# Altium schematic symbol library hphonglib.SchLib: 1131 symbols (part 2 of 8) (continued)
## AVR.ATmega3250
designator IC?  (value not drawn)
Manufacturer: Atmel; Flash: Kb; SRAM: Bytes; Volt: V; CPU Speed (MIPS): 0 MIPS; ComponentLink1Description: Degikey Part link; ComponentLink2Description: Open DataSheet; ComponentLink2URL: H:\LIBRARY\LIBRARY.Datasheet\; Publisher: Hoang Nguyen
footprint TQFP100
pins: 1 DNC, 2 PE0(RXD/PCINT0) (io), 3 PE1(TXD/PCINT1) (io), 4 PE2(XCK/AIN0/PCINT2) (io), 5 PE3(AIN1/PCINT3) (io), 6 PE4(USCK/SCL/PCINT4) (io), 7 PE5(DI/SDA/PCINT5) (io), 8 PE6(DO/PCINT6) (io), 9 PE7(CLKO/PCINT7) (io), 10 VCC, 11 GND, 12 DNC, 13 PJ0(PCINT24) (io), 14 PJ1(PCINT25) (io), 15 DNC, 16 DNC, 17 DNC, 18 DNC, 19 (~{SS}/PCINT8)PB0 (io), 20 (SCK/PCINT9)PB1 (io), 21 (MOSI/PCINT10)PB2 (io), 22 (MISO/PCINT11)PB3 (io), 23 (OC0A/PCINT12)PB4 (io), 24 (OC1A/PCINT13)PB5 (io), 25 (OC1B/PCINT14)PB6 (io), 26 (OC2A/PCINT15)PB7 (io), 27 DNC, 28 PG3(T1) (io), 29 PG4(T0) (io), 30 PG5(~{RESET}) (in), 31 VCC, 32 GND, 33 XTAL2(TOSC2), 34 XTAL1(TOSC1), 35 DNC, 36 DNC, 37 PJ2(PCINT26) (io), 38 PJ3(PCINT27) (io), 39 PJ4(PCINT28) (io), 40 PJ5(PCINT29) (io), 41 PJ6(PCINT30) (io), 42 DNC, 43 (ICP1)PD0 (io), 44 (INT0)PD1 (io), 45 PD2 (io), 46 PD3 (io), 47 PD4 (io), 48 PD5 (io), 49 PD6 (io), 50 PD7 (io), 51 PG0 (io), 52 PG1 (io), 53 PC0 (io), 54 PC1 (io), 55 PC2 (io), 56 PC3 (io), 57 PC4 (io), 58 PC5 (io), 59 DNC, 60 DNC, 61 DNC, 62 DNC, 63 (PCINT16)PH0 (io), 64 (PCINT17)PH1 (io), 65 (PCINT18)PH2 (io), 66 (PCINT19)PH3 (io), 67 DNC, 68 PC6 (io), 69 PC7 (io), 70 PG2 (io), 71 PA7 (io), 72 PA6 (io), 73 PA5 (io), 74 PA4 (io), 75 PA3 (io), 76 PA2 (io), 77 PA1 (io), 78 PA0 (io), 79 DNC, 80 VCC, 81 GND, 82 DNC, 83 DNC, 84 (PCINT20)PH4 (io), 85 (PCINT21)PH5 (io), 86 (PCINT22)PH6 (io), 87 (PCINT23)PH7 (io), 88 DNC, 89 DNC, 90 (TDI/ADC7)PF7 (io), 91 (TDO/ADC6)PF6 (io), 92 (TMS/ADC5)PF5 (io), 93 (TCK/ADC4)PF4 (io), 94 (ADC3)PF3 (io), 95 (ADC2)PF2 (io), 96 (ADC1)PF1 (io), 97 (ADC0)PF0 (io), 98 AREF, 99 AGND, 100 AVCC

## AVR.ATmega3290
designator IC?
Manufacturer: Atmel; Flash: Kb; SRAM: Bytes; Volt: V; CPU Speed (MIPS): 0 MIPS; ComponentLink1Description: Degikey Part link; ComponentLink2Description: Open DataSheet; ComponentLink2URL: H:\LIBRARY\LIBRARY.Datasheet\; Publisher: Hoang Nguyen
footprint TQFP100
pins: 1 DNC, 2 PE0(RXD/PCINT0) (io), 3 PE1(TXD/PCINT1) (io), 4 PE2(XCK/AIN0/PCINT2) (io), 5 PE3(AIN1/PCINT3) (io), 6 PE4(USCK/SCL/PCINT4) (io), 7 PE5(DI/SDA/PCINT5) (io), 8 PE6(DO/PCINT6) (io), 9 PE7(CLKO/PCINT7) (io), 10 VCC, 11 GND, 12 DNC, 13 PJ0(PCINT24) (io), 14 PJ1(PCINT25) (io), 15 DNC, 16 DNC, 17 DNC, 18 DNC, 19 (~{SS}/PCINT8)PB0 (io), 20 (SCK/PCINT9)PB1 (io), 21 (MOSI/PCINT10)PB2 (io), 22 (MISO/PCINT11)PB3 (io), 23 (OC0A/PCINT12)PB4 (io), 24 (OC1A/PCINT13)PB5 (io), 25 (OC1B/PCINT14)PB6 (io), 26 (OC2A/PCINT15)PB7 (io), 27 DNC, 28 PG3(Seg23/T1) (io), 29 PG4(Seg24/T0) (io), 30 PG5(~{RESET}) (in), 31 VCC, 32 GND, 33 XTAL2(TOSC2), 34 XTAL1(TOSC1), 35 DNC, 36 DNC, 37 PJ2(PCINT26) (io), 38 PJ3(PCINT27) (io), 39 PJ4(PCINT28) (io), 40 PJ5(PCINT29) (io), 41 PJ6(PCINT30) (io), 42 DNC, 43 PD0(Seg22/ICP1) (io), 44 PD1(Seg21/INT0) (io), 45 PD2(Seg20) (io), 46 PD3(Seg19) (io), 47 PD4(Seg18) (io), 48 PD5(Seg17) (io), 49 PD6(Seg16) (io), 50 PD7(Seg15) (io), 51 PG0(Seg14) (io), 52 PG1(Seg13) (io), 53 PC0(Seg12) (io), 54 PC1(Seg11) (io), 55 PC2(Seg10) (io), 56 PC3(Seg9) (io), 57 PC4(Seg8) (io), 58 PC5(Seg7) (io), 59 DNC, 60 DNC, 61 DNC, 62 DNC, 63 (PCINT16)PH0 (io), 64 (PCINT17)PH1 (io), 65 (PCINT18)PH2 (io), 66 (PCINT19)PH3 (io), 67 DNC, 68 PC6(Seg6) (io), 69 PC7(Seg5) (io), 70 PG2(Seg4) (io), 71 PA7(Seg3) (io), 72 PA6(Seg2) (io), 73 PA5(Seg1) (io), 74 PA4(Seg0) (io), 75 PA3(COM3) (io), 76 PA2(COM2) (io), 77 PA1(COM1) (io), 78 PA0(COM0) (io), 79 DNC, 80 VCC, 81 GND, 82 DNC, 83 DNC, 84 (PCINT20)PH4 (io), 85 (PCINT21)PH5 (io), 86 (PCINT22)PH6 (io), 87 (PCINT23)PH7 (io), 88 DNC, 89 DNC, 90 (TDI/ADC7)PF7 (io), 91 (TDO/ADC6)PF6 (io), 92 (TMS/ADC5)PF5 (io), 93 (TCK/ADC4)PF4 (io), 94 (ADC3)PF3 (io), 95 (ADC2)PF2 (io), 96 (ADC1)PF1 (io), 97 (ADC0)PF0 (io), 98 AREF, 99 AGND, 100 AVCC

## AVR.ATMEGA8535
designator U?  (value not drawn)
Atmel AVR MCU; Flash: Kb; SRAM: Bytes; Volt: V; CPU Speed (MIPS): 0 MIPS; ComponentLink1Description: Degikey Part link; ComponentLink2Description: Open DataSheet; ComponentLink2URL: H:\LIBRARY\LIBRARY.Datasheet\; Manufacturer: Atmel; Publisher: Hoang Nguyen
footprint IC40N
pins: 1 PB0/XCT/T0, 2 PB1/T1, 3 PB2/INT2/AIN0, 4 PB3/OC0/AIN1, 5 PB4/[SS], 6 PB5/MOSI, 7 PB6/MISO, 8 PB7/SCK, 9 [RESET], 10 VCC, 11 GND, 12 XTAL2, 13 XTAL1, 14 PD0/RXD, 15 PD1/TXD, 16 PB2/INT0, 17 PD3/INT1, 18 PD4/OC1B, 19 PD5/OC1A, 20 PD6/ICP1, 21 PD7/OC2, 22 PC0/SCL, 23 PC1/SDA, 24 PC2, 25 PC3, 26 PC4, 27 PC5, 28 PC6/TOSC1, 29 PC7/TOSC2, 30 AVCC, 31 GND, 32 AREF, 33 PA7/ADC7, 34 PA6/ADC6, 35 PA5/ADC5, 36 PA4/ADC4, 37 PA3/ADC3, 38 PA2/ADC2, 39 PA1/ADC1, 40 PA0/ADC0

## AVR.ATMEGA8535-DIL40
designator IC?
Manufacturer: Atmel; Flash: Kb; SRAM: Bytes; Volt: V; CPU Speed (MIPS): 0 MIPS; ComponentLink1Description: Degikey Part link; ComponentLink2Description: Open DataSheet; ComponentLink2URL: H:\LIBRARY\LIBRARY.Datasheet\; Publisher: Hoang Nguyen
pins: 1 PB0(XCK/T0) (io), 2 PB1(T1) (io), 3 PB2(INT2/AIN0) (io), 4 PB3(OC0/AIN1) (io), 5 PB4(~{SS}) (io), 6 PB5(MOSI) (io), 7 PB6[MISO) (io), 8 PB7[SCK) (io), 9 ~{RESET} (in), 10 VCC, 11 GND, 12 XTAL2, 13 XTAL1, 14 PD0(RXD) (io), 15 PD1(TXD) (io), 16 PD2(INT0) (io), 17 PD3(INT1) (io), 18 PD4(OC1B) (io), 19 PD5(OC1A) (io), 20 PD6(ICP) (io), 21 PD7(OC2) (io), 22 PC0(SCL) (io), 23 PC1(SDA) (io), 24 PC2 (io), 25 PC3 (io), 26 PC4 (io), 27 PC5 (io), 28 PC6(TOSC1) (io), 29 PC7(TOSC2) (io), 30 AVCC, 31 AGND, 32 AREF, 33 PA7(ADC7) (io), 34 PA6(ADC6) (io), 35 PA5(ADC5) (io), 36 PA4(ADC4) (io), 37 PA3(ADC3) (io), 38 PA2(ADC2) (io), 39 PA1(ADC1) (io), 40 PA0(ADC0) (io)

## AVR.ATMEGA8535-PLCC44
designator IC?
Manufacturer: Atmel; Flash: Kb; SRAM: Bytes; Volt: V; CPU Speed (MIPS): 0 MIPS; ComponentLink1Description: Degikey Part link; ComponentLink2Description: Open DataSheet; ComponentLink2URL: H:\LIBRARY\LIBRARY.Datasheet\; Publisher: Hoang Nguyen
pins: 1 GND, 2 PB0(XCK/T0) (io), 3 PB1(T1) (io), 4 PB2(INT2/AIN0) (io), 5 PB3(OC0/AIN1) (io), 6 PB4(~{SS}) (io), 7 PB5(MOSI) (io), 8 PB6[MISO) (io), 9 PB7[SCK) (io), 10 ~{RESET} (in), 11 VCC, 12 GND, 13 XTAL2, 14 XTAL1, 15 PD0(RXD) (io), 16 PD1(TXD) (io), 17 PD2(INT0) (io), 18 PD3(INT1) (io), 19 PD4(OC1B) (io), 20 PD5(OC1A) (io), 21 PD6(ICP) (io), 22 PD7(OC2) (io), 23 VCC, 24 GND, 25 PC0(SCL) (io), 26 PC1(SDA) (io), 27 PC2 (io), 28 PC3 (io), 29 PC4 (io), 30 PC5 (io), 31 PC6 (io), 32 PC7 (io), 33 AVCC, 34 AGND, 35 AREF, 36 PA7(ADC7) (io), 37 PA6(ADC6) (io), 38 PA5(ADC5) (io), 39 PA4(ADC4) (io), 40 PA3(ADC3) (io), 41 PA2(ADC2) (io), 42 PA1(ADC1) (io), 43 PA0(ADC0) (io), 44 VCC

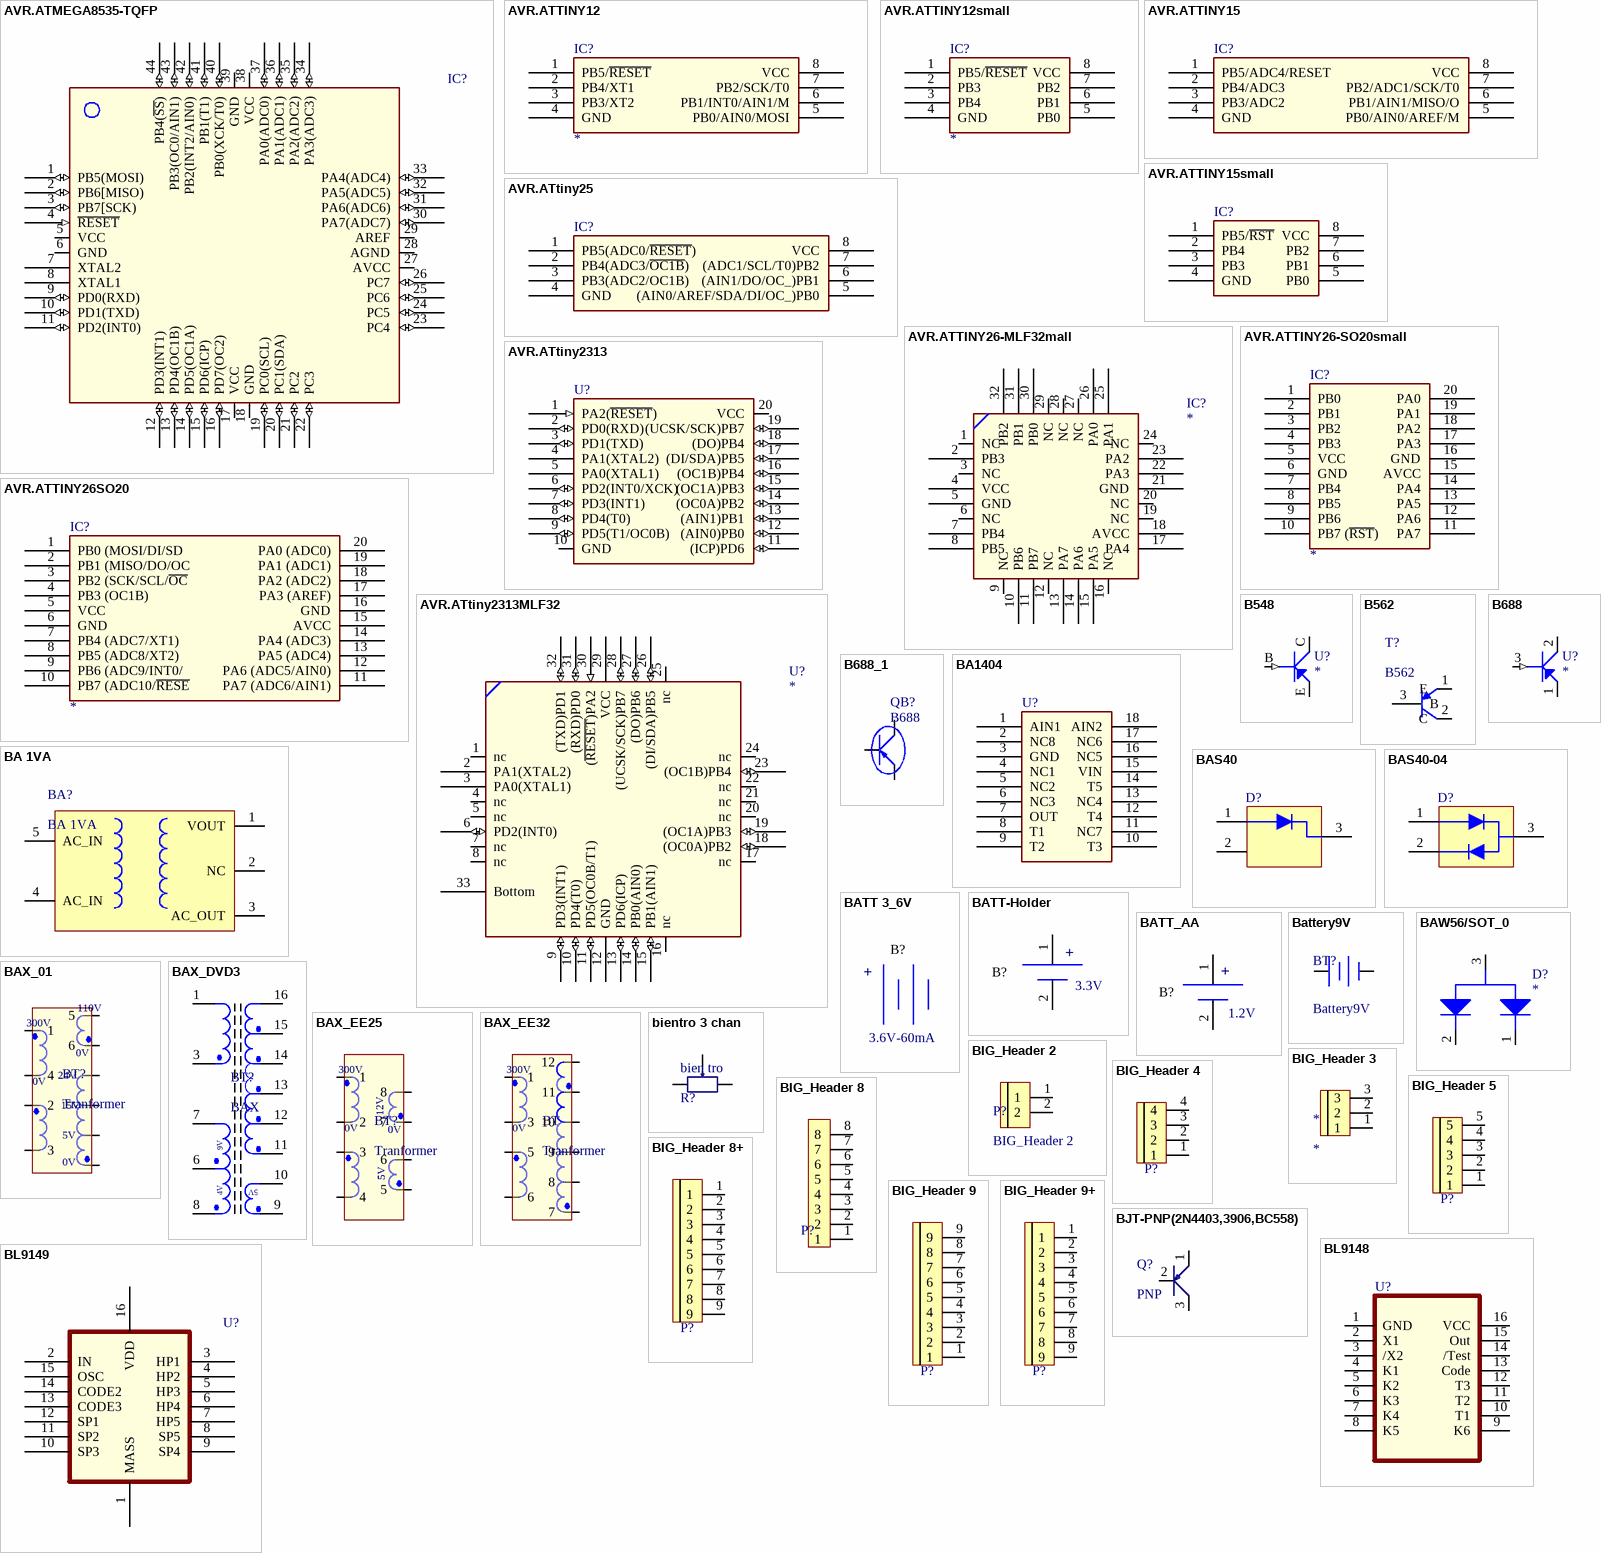
[diagram p10: symbols AVR.ATMEGA8535-TQFP to BL9149]

## AVR.ATMEGA8535-TQFP
designator IC?  (value not drawn)
Manufacturer: Atmel; Flash: Kb; SRAM: Bytes; Volt: V; CPU Speed (MIPS): 0 MIPS; ComponentLink1Description: Degikey Part link; ComponentLink2Description: Open DataSheet; ComponentLink2URL: H:\LIBRARY\LIBRARY.Datasheet\; Publisher: Hoang Nguyen
pins: 1 PB5(MOSI) (io), 2 PB6[MISO) (io), 3 PB7[SCK) (io), 4 ~{RESET} (in), 5 VCC, 6 GND, 7 XTAL2, 8 XTAL1, 9 PD0(RXD) (io), 10 PD1(TXD) (io), 11 PD2(INT0) (io), 12 PD3(INT1) (io), 13 PD4(OC1B) (io), 14 PD5(OC1A) (io), 15 PD6(ICP) (io), 16 PD7(OC2) (io), 17 VCC, 18 GND, 19 PC0(SCL) (io), 20 PC1(SDA) (io), 21 PC2 (io), 22 PC3 (io), 23 PC4 (io), 24 PC5 (io), 25 PC6 (io), 26 PC7 (io), 27 AVCC, 28 AGND, 29 AREF, 30 PA7(ADC7) (io), 31 PA6(ADC6) (io), 32 PA5(ADC5) (io), 33 PA4(ADC4) (io), 34 PA3(ADC3) (io), 35 PA2(ADC2) (io), 36 PA1(ADC1) (io), 37 PA0(ADC0) (io), 38 VCC, 39 GND, 40 PB0(XCK/T0) (io), 41 PB1(T1) (io), 42 PB2(INT2/AIN0) (io), 43 PB3(OC0/AIN1) (io), 44 PB4(~{SS}) (io)

## AVR.ATTINY12
designator IC?
Manufacturer: Atmel; Flash: Kb; SRAM: Bytes; Volt: V; CPU Speed (MIPS): 0 MIPS; ComponentLink1Description: Degikey Part link; ComponentLink2Description: Open DataSheet; ComponentLink2URL: H:\LIBRARY\LIBRARY.Datasheet\; Publisher: Hoang Nguyen
pins: 1 PB5/~{RESET}, 2 PB4/XT1, 3 PB3/XT2, 4 GND, 5 PB0/AIN0/MOSI, 6 PB1/INT0/AIN1/M, 7 PB2/SCK/T0, 8 VCC

## AVR.ATTINY12small
designator IC?
Manufacturer: Atmel; Flash: Kb; SRAM: Bytes; Volt: V; CPU Speed (MIPS): 0 MIPS; ComponentLink1Description: Degikey Part link; ComponentLink2Description: Open DataSheet; ComponentLink2URL: H:\LIBRARY\LIBRARY.Datasheet\; Publisher: Hoang Nguyen
pins: 1 PB5/~{RESET}, 2 PB3, 3 PB4, 4 GND, 5 PB0, 6 PB1, 7 PB2, 8 VCC

## AVR.ATTINY15
designator IC?  (value not drawn)
Manufacturer: Atmel; Flash: Kb; SRAM: Bytes; Volt: V; CPU Speed (MIPS): 0 MIPS; ComponentLink1Description: Degikey Part link; ComponentLink2Description: Open DataSheet; ComponentLink2URL: H:\LIBRARY\LIBRARY.Datasheet\; Publisher: Hoang Nguyen
pins: 1 PB5/ADC4/RESET, 2 PB4/ADC3, 3 PB3/ADC2, 4 GND, 5 PB0/AIN0/AREF/M, 6 PB1/AIN1/MISO/O, 7 PB2/ADC1/SCK/T0, 8 VCC

## AVR.ATTINY15small
designator IC?  (value not drawn)
Manufacturer: Atmel; Flash: Kb; SRAM: Bytes; Volt: V; CPU Speed (MIPS): 0 MIPS; ComponentLink1Description: Degikey Part link; ComponentLink2Description: Open DataSheet; ComponentLink2URL: H:\LIBRARY\LIBRARY.Datasheet\; Publisher: Hoang Nguyen
pins: 1 PB5/~{RST}, 2 PB4, 3 PB3, 4 GND, 5 PB0, 6 PB1, 7 PB2, 8 VCC

## AVR.ATtiny25
designator IC?  (value not drawn)
Manufacturer: Atmel; Flash: Kb; SRAM: Bytes; Volt: V; CPU Speed (MIPS): 0 MIPS; ComponentLink1Description: Degikey Part link; ComponentLink2Description: Open DataSheet; ComponentLink2URL: H:\LIBRARY\LIBRARY.Datasheet\; Publisher: Hoang Nguyen
footprint DIL/SO8
pins: 1 PB5(ADC0/~{RESET}), 2 PB4(ADC3/~{OC1B}), 3 PB3(ADC2/OC1B), 4 GND, 5 (AIN0/AREF/SDA/DI/OC_)PB0, 6 (AIN1/DO/OC_)PB1, 7 (ADC1/SCL/T0)PB2, 8 VCC

## AVR.ATTINY26-MLF32mall
designator IC?
Manufacturer: Atmel; Flash: Kb; SRAM: Bytes; Volt: V; CPU Speed (MIPS): 0 MIPS; ComponentLink1Description: Degikey Part link; ComponentLink2Description: Open DataSheet; ComponentLink2URL: H:\LIBRARY\LIBRARY.Datasheet\; Publisher: Hoang Nguyen
pins: 1 NC, 2 PB3 (hiz), 3 NC, 4 VCC, 5 GND, 6 NC, 7 PB4 (hiz), 8 PB5 (hiz), 9 NC, 10 PB6 (hiz), 11 PB7 (hiz), 12 NC, 13 PA7 (hiz), 14 PA6 (hiz), 15 PA5 (hiz), 16 NC, 17 PA4 (hiz), 18 AVCC, 19 NC, 20 NC, 21 GND, 22 PA3 (hiz), 23 PA2 (hiz), 24 NC, 25 PA1 (hiz), 26 PA0 (hiz), 27 NC, 28 NC, 29 NC, 30 PB0 (hiz), 31 PB1 (hiz), 32 PB2 (hiz)

## AVR.ATTINY26-SO20small
designator IC?
Manufacturer: Atmel; Flash: Kb; SRAM: Bytes; Volt: V; CPU Speed (MIPS): 0 MIPS; ComponentLink1Description: Degikey Part link; ComponentLink2Description: Open DataSheet; ComponentLink2URL: H:\LIBRARY\LIBRARY.Datasheet\; Publisher: Hoang Nguyen
pins: 1 PB0 (hiz), 2 PB1 (hiz), 3 PB2 (hiz), 4 PB3 (hiz), 5 VCC, 6 GND, 7 PB4 (hiz), 8 PB5 (hiz), 9 PB6 (hiz), 10 PB7 (~{RST}) (hiz), 11 PA7 (hiz), 12 PA6 (hiz), 13 PA5 (hiz), 14 PA4 (hiz), 15 AVCC, 16 GND, 17 PA3 (hiz), 18 PA2 (hiz), 19 PA1 (hiz), 20 PA0 (hiz)

## AVR.ATTINY26SO20
designator IC?
Manufacturer: Atmel; Flash: Kb; SRAM: Bytes; Volt: V; CPU Speed (MIPS): 0 MIPS; ComponentLink1Description: Degikey Part link; ComponentLink2Description: Open DataSheet; ComponentLink2URL: H:\LIBRARY\LIBRARY.Datasheet\; Publisher: Hoang Nguyen
pins: 1 PB0 (MOSI/DI/SD (hiz), 2 PB1 (MISO/DO/OC (hiz), 3 PB2 (SCK/SCL/~{OC} (hiz), 4 PB3 (OC1B) (hiz), 5 VCC, 6 GND, 7 PB4 (ADC7/XT1) (hiz), 8 PB5 (ADC8/XT2) (hiz), 9 PB6 (ADC9/INT0/ (hiz), 10 PB7 (ADC10/~{RESE} (hiz), 11 PA7 (ADC6/AIN1) (hiz), 12 PA6 (ADC5/AIN0) (hiz), 13 PA5 (ADC4) (hiz), 14 PA4 (ADC3) (hiz), 15 AVCC, 16 GND, 17 PA3 (AREF) (hiz), 18 PA2 (ADC2) (hiz), 19 PA1 (ADC1) (hiz), 20 PA0 (ADC0) (hiz)

## AVR.ATtiny2313
designator U?  (value not drawn)
Manufacturer: Atmel; Flash: Kb; SRAM: Bytes; Volt: V; CPU Speed (MIPS): 0 MIPS; ComponentLink1Description: Degikey Part link; ComponentLink2Description: Open DataSheet; ComponentLink2URL: H:\LIBRARY\LIBRARY.Datasheet\; Publisher: Hoang Nguyen
pins: 1 PA2(~{RESET}) (in), 2 PD0(RXD) (io), 3 PD1(TXD) (io), 4 PA1(XTAL2), 5 PA0(XTAL1), 6 PD2(INT0/XCK) (io), 7 PD3(INT1) (io), 8 PD4(T0) (io), 9 PD5(T1/OC0B) (io), 10 GND, 11 (ICP)PD6 (io), 12 (AIN0)PB0 (io), 13 (AIN1)PB1 (io), 14 (OC0A)PB2 (io), 15 (OC1A)PB3 (io), 16 (OC1B)PB4 (io), 17 (DI/SDA)PB5 (io), 18 (DO)PB4 (io), 19 (UCSK/SCK)PB7 (io), 20 VCC

## AVR.ATtiny2313MLF32
designator U?
Manufacturer: Atmel; Flash: Kb; SRAM: Bytes; Volt: V; CPU Speed (MIPS): 0 MIPS; ComponentLink1Description: Degikey Part link; ComponentLink2Description: Open DataSheet; ComponentLink2URL: H:\LIBRARY\LIBRARY.Datasheet\; Publisher: Hoang Nguyen
pins: 1 nc, 2 PA1(XTAL2), 3 PA0(XTAL1), 4 nc, 5 nc, 6 PD2(INT0) (io), 7 nc, 8 nc, 9 PD3(INT1) (io), 10 PD4(T0) (io), 11 PD5(OC0B/T1) (io), 12 GND, 13 PD6(ICP) (io), 14 PB0(AIN0) (io), 15 PB1(AIN1) (io), 16 nc, 17 nc, 18 (OC0A)PB2 (io), 19 (OC1A)PB3 (io), 20 nc, 21 nc, 22 nc, 23 (OC1B)PB4 (io), 24 nc, 25 nc, 26 (DI/SDA)PB5 (io), 27 (DO)PB6 (io), 28 (UCSK/SCK)PB7 (io), 29 VCC, 30 (~{RESET})PA2 (in), 31 (RXD)PD0 (io), 32 (TXD)PD1 (io), 33 Bottom

## B548
designator U?
Vendor: Digikey; Published: 13-April-2009; Publisher: Hoang Nguyen; ComponentLink1Description: Digikey Part Link; ComponentLink2Description: Open Datasheet; ComponentLink2URL: H:\LIBRARY\LIBRARY.Datasheet\
pins: B BASE (in), C COLLECTOR, E EMITOR

## B562
designator T?
footprint TO-220-3 (TO-220; 3 Leads; Solder Pad 35mil)
pins: 1 E, 2 C, 3 B

## B688
designator U?
Vendor: Digikey; Published: 13-April-2009; Publisher: Hoang Nguyen; ComponentLink1Description: Digikey Part Link; ComponentLink2Description: Open Datasheet; ComponentLink2URL: H:\LIBRARY\LIBRARY.Datasheet\
pins: 1 EMITOR, 2 COLLECTOR, 3 BASE (in)

## B688_1
designator QB?, comment B688
Transistor Power Supply; Value: B688
footprint QTO-247 (TO-247)
pins: 1 B, 2 C, 3 E

## BA1404
designator U?  (value not drawn)
HI-FI Stereo FM Transmitter 88 - 108 MHz; Vendor: Digikey; Published: 13-April-2009; Publisher: Hoang Nguyen; ComponentLink1Description: Digikey Part Link; ComponentLink2Description: Open Datasheet; ComponentLink2URL: H:\LIBRARY\LIBRARY.Datasheet\
pins: 1 AIN1, 2 NC8, 3 GND (power), 4 NC1, 5 NC2, 6 NC3, 7 OUT, 8 T1, 9 T2, 10 T3, 11 NC7, 12 T4, 13 NC4, 14 T5, 15 VIN, 16 NC5, 17 NC6, 18 AIN2

## BA 1VA
designator BA?
footprint BA 1VA
pins: 1 VOUT, 2 NC, 3 AC_OUT, 4 AC_IN, 5 AC_IN

## BAS40
designator D?
Schottky Diode; Vendor: Digikey; Published: 5-Jan-2004; DatasheetDocument: Rev. 1.4, 14-Oct-03; Publisher: Altium Limited; ComponentLink1Description: Digikey Part Link; ComponentLink2Description: Open Datasheet; ComponentLink2URL: H:\LIBRARY\LIBRARY.Datasheet\
footprint SO-G3 (SOT-23; 3 Leads; 1.9mm x 2.2 mm (LxW))
pcadlib SO-G3 (SOT-23; 3 Leads; 1.9mm x 2.2 mm (LxW))
pins: 1, 2, 3

## BAS40-04
designator D?
Dual Schottky Diode, series connected; Vendor: Digikey; Published: 5-Jan-2004; DatasheetDocument: Rev. 1.4, 14-Oct-03; Publisher: Altium Limited; ComponentLink1Description: Digikey Part Link; ComponentLink2Description: Open Datasheet; ComponentLink2URL: H:\LIBRARY\LIBRARY.Datasheet\
footprint SO-G3 (SOT-23; 3 Leads; 1.9mm x 2.2 mm (LxW))
pcadlib SO-G3 (SOT-23; 3 Leads; 1.9mm x 2.2 mm (LxW))
pins: 1, 2, 3

## BATT 3_6V
designator B?  value 3.6V-60mA  (hidden comment: *)
NiCa battery c.s. 3.6V 60 mA; Vendor: Digikey; Published: 13-April-2009; Publisher: Hoang Nguyen; ComponentLink1Description: Digikey Part Link; ComponentLink2Description: Open Datasheet; ComponentLink2URL: H:\LIBRARY\LIBRARY.Datasheet\
footprint BATT-Li-3.6V-60mA
footprint BATT-Li-3.3V
text: +

## BATT-Holder
designator B?  value 3.3V  (hidden comment: *)
Battery holder; Manufacturer: China; Vendor: Digikey; Publisher: Hoang Nguyen; Published: 13-April-2009; ComponentLink1Description: Digikey Part Link; ComponentLink2Description: Open Datasheet; ComponentLink2URL: H:\LIBRARY\LIBRARY.Datasheet\; Price: 3000 VND
footprint Batt_Holder (Battery Holders)
footprint BATT-LI-Bott-20mm
footprint BATT-LI-Bott-22mm
footprint BATT-LI-Bott-22mm_N
pins: 1 +, 2 -

## BATT_AA
designator B?  value 1.2V  (hidden comment: *)
Battery SMD type AA; Vendor: Digikey; Published: 13-April-2009; Publisher: Hoang Nguyen; ComponentLink1Description: Digikey Part Link; ComponentLink2Description: Open Datasheet; ComponentLink2URL: H:\LIBRARY\LIBRARY.Datasheet\
footprint BATT_AA
pins: 1 P, 2 N
text: +

## Battery9V
designator BT?
Multicell Battery; Published: 24-Mar-1999; LatestRevisionDate: 17-Jul-2002; LatestRevisionNote: Re-released for DXP Platform.; PackageReference: BAT-2; Publisher: Altium Limited
footprint HDR1X2 (Connector; Header; 2 Position)
pins: 1 +, 2 -

## BAW56/SOT_0
designator D?
ComponentLink1Description: Digikey Part Link; ComponentLink2Description: Open Datasheet; ComponentLink2URL: H:\LIBRARY\LIBRARY.Datasheet\
pins: 1, 2, 3

## BAX_01
designator BT?, comment Tranformer
Value: BA xung
footprint BAX_01 (Bien ap xung cho nguon T9AT)
pins: 1, 2, 3, 4, 5, 6, 7, 8, 9, 10
text: 110V; 300V; 0V; 24V; 15V; 5V

## BAX_DVD3
designator BT?, comment BAX
Bien ap xung DVD; Designed by: VanDungEvn; Value: BAX
footprint BAX_DVD3 (Bien ap xung DVD3)
pins: 1, 3, 6, 7, 8, 9, 10, 11, 12, 13, 14, 15, 16
text: 9V; 5V; 4V

## BAX_EE25
designator BT?, comment Tranformer
Value: BA xung
footprint BAX_EE25 (EE25)
pins: 1, 2, 3, 4, 5, 6, 7, 8
text: 300V; 12V; 0V; 5V

## BAX_EE32
designator BT, comment Tranformer
Value: BA xung
footprint BAX_EE32 (EE32)
pins: 1, 3, 5, 6, 7, 8, 9, 10, 11, 12
text: 300V; 0V

## bientro 3 chan
designator bien tro, comment R?
pins: 1, 2, 3

## BIG_Header 2
designator P?
footprint BIG_Header 2
pins: 1, 2

## BIG_Header 3
designator *
footprint BIG_Header 3
pins: 1, 2, 3

## BIG_Header 4
designator P?, comment BIG Header 4  (value not drawn)
footprint BIG_Header 4
pins: 1, 2, 3, 4

## BIG_Header 5
designator P?, comment BIG Header 4  (value not drawn)
footprint BIG_Header 5
pins: 1, 2, 3, 4, 5

## BIG_Header 8
designator P?, comment BIG Heager 8  (value not drawn)
footprint BIG_Header 8
pins: 1, 2, 3, 4, 5, 6, 7, 8

## BIG_Header 8+
designator P?, comment BIG Heager 8+  (value not drawn)
footprint BIG_Header 9
pins: 1, 2, 3, 4, 5, 6, 7, 8, 9

## BIG_Header 9
designator P?, comment BIG Heager 9  (value not drawn)
footprint BIG_Header 9
pins: 1, 2, 3, 4, 5, 6, 7, 8, 9

## BIG_Header 9+
designator P?, comment BIG Heager 9+  (value not drawn)
footprint BIG_Header 9
pins: 1, 2, 3, 4, 5, 6, 7, 8, 9

## BJT-PNP(2N4403,3906,BC558)
designator Q?, comment PNP
footprint 4403PNP
pins: 1 E, 2 B, 3 C

## BL9148
designator U?  (value not drawn)
General infrared Ray Remote Control Transmitter; Vendor: Digikey; Published: 13-April-2009; Publisher: Hoang Nguyen; ComponentLink1Description: Digikey Part Link; ComponentLink2Description: Open Datasheet; ComponentLink2URL: H:\LIBRARY\LIBRARY.Datasheet\
pins: 1 GND (power), 2 X1, 3 /X2, 4 K1, 5 K2, 6 K3, 7 K4, 8 K5, 9 K6, 10 T1, 11 T2, 12 T3, 13 Code, 14 /Test, 15 Out, 16 VCC (power)

## BL9149
designator U?  (value not drawn)
Infrared Ray Remote Control  Receiver; Vendor: Digikey; Published: 13-April-2009; Publisher: Hoang Nguyen; ComponentLink1Description: Digikey Part Link; ComponentLink2Description: Open Datasheet; ComponentLink2URL: H:\LIBRARY\LIBRARY.Datasheet\
footprint Dip16
pins: 1 MASS, 2 IN, 3 HP1, 4 HP2, 5 HP3, 6 HP4, 7 HP5, 8 SP5, 9 SP4, 10 SP3, 11 SP2, 12 SP1, 13 CODE3, 14 CODE2, 15 OSC, 16 VDD
